# Altium footprint library MyLib.PcbLib: 575 footprints (part 14 of 36)
Each footprint in its own frame and in the unit in brackets; x right, y up, seen from the top. Pads: shape width x height; smd on the part's side, far side on the other; paste and mask are expansions set on the pad; w line width, h text height; cw(c..) or ccw(c..) is an arc to the next point about the centre after c.
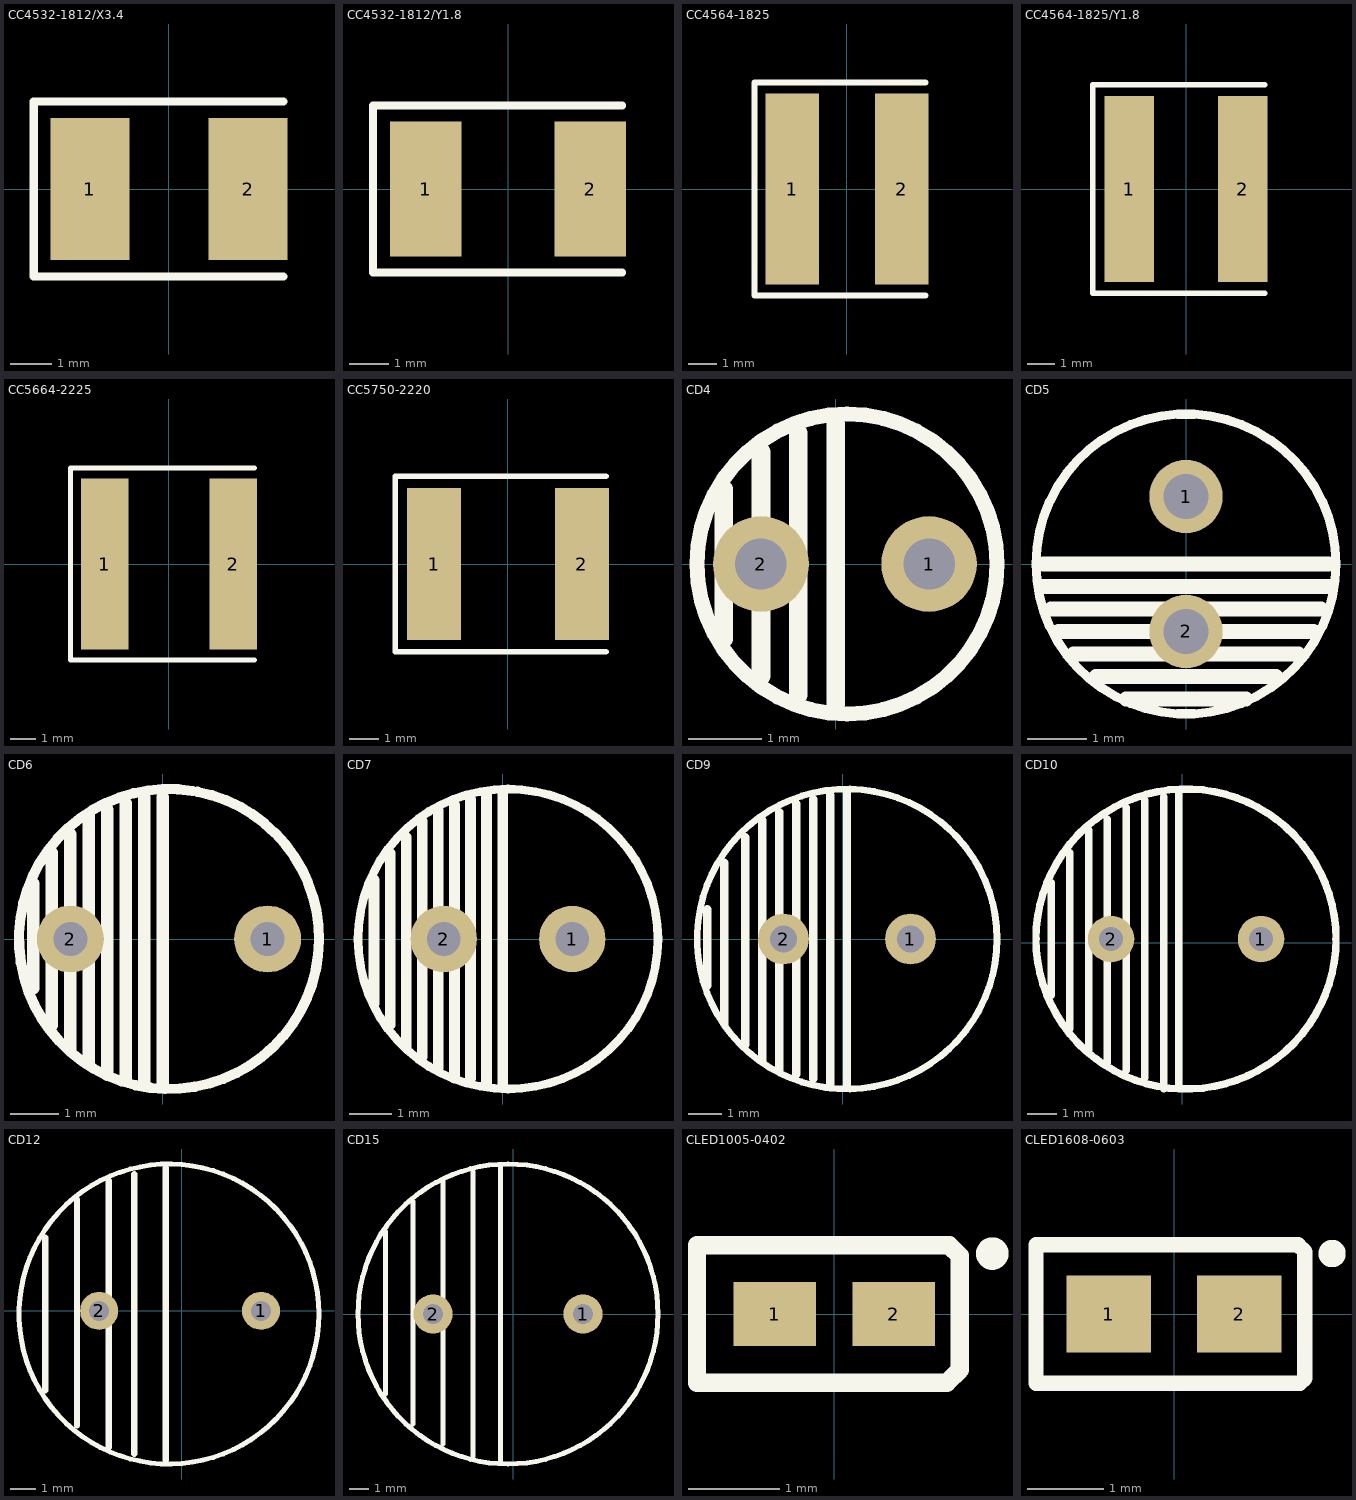
[diagram p13: the footprints below, top view; thin cyan lines are the x and y axes]

## CC4532-1812/X3.4 [mm]
pads (2):
  rect 1.9x3.4 smd: 1(-1.9,0) 2(1.9,0)
Top Overlay:
  lines w0.2: 2.75,-2.1 -3.25,-2.1 -3.25,2.1 2.75,2.1

## CC4532-1812/Y1.8 [mm]
pads (2):
  rect 1.8x3.4 smd: 1(-2.075,0) 2(2.075,0)
Top Overlay:
  lines w0.2: 2.875,-2.1 -3.4,-2.1 -3.4,2.1 2.875,2.1

## CC4564-1825 [mm]
pads (2):
  rect 1.9x6.8 smd: 1(-1.95,0) 2(1.95,0)
Top Overlay:
  lines w0.2: 2.8,-3.8 -3.3,-3.8 -3.3,3.8 2.8,3.8

## CC4564-1825/Y1.8 [mm]
pads (2):
  rect 1.8x6.8 smd: 1(-2.075,0) 2(2.075,0)
Top Overlay:
  lines w0.2: 2.875,-3.8 -3.4,-3.8 -3.4,3.8 2.875,3.8

## CC5664-2225 [mm]
pads (2):
  rect 1.9x6.8 smd: 1(-2.55,0) 2(2.55,0)
Top Overlay:
  lines w0.2: 3.4,-3.8 -3.9,-3.8 -3.9,3.8 3.4,3.8

## CC5750-2220 [mm]
pads (2):
  rect 1.85x5.2 smd: 1(-2.525,0) 2(2.525,0)
Top Overlay:
  lines w0.2: 3.35,-3 -3.85,-3 -3.85,3 3.35,3

## CD4 [mm]
pads (2):
  round 1.3 hole 0.7: 1(1.27,0) 2(-1.016,0)
Top Overlay:
  circle w0.203: c0.154,0 r2.04
  lines w0.254: -1.524,-1.016 -1.524,1.016 ; -1.016,-1.524 -1.016,1.524 ; -0.508,-1.778 -0.508,1.778 ; 0,-1.905 0,1.905
3D body "CAP PR1.5x4x7mm.STEP": height 7.06, standoff -16.94, extent -1.873,-2.032 2.127,1.968

## CD5 [mm]
pads (2):
  round 1.24 hole 0.762: 1(0,1.143) 2(0,-1.143)
Top Overlay:
  circle w0.154: c0,0 r2.54
  lines w0.254: -2.413,-0.381 2.413,-0.381 ; -2.413,0 2.413,0 ; -2.286,-0.762 2.286,-0.762 ; -2.159,-1.143 2.159,-1.143 ; -1.905,-1.524 1.905,-1.524 ; -1.524,-1.905 1.524,-1.905 ; -1.016,-2.286 1.016,-2.286
3D body "CAP PR2.0x5x11mm.STEP": height 11.53, standoff -3.27, extent -2.511,-2.652 2.54,2.398

## CD6 [mm]
pads (2):
  round 1.38 hole 0.7: 1(2.159,0) 2(-1.905,0)
Top Overlay:
  lines w0.21: 0.61,3.052 ccw(c0.127,0) 0.717,3.033
  lines w0.254: -2.667,-1.016 -2.667,1.143 ; -2.286,-1.778 -2.286,1.778 ; -1.905,-2.286 -1.905,2.159 ; -1.524,-2.54 -1.524,2.54 ; -1.143,-2.794 -1.143,2.667 ; -0.762,-2.921 -0.762,2.794 ; -0.381,-2.921 -0.381,2.921 ; 0,-3.048 0,2.921
3D body "CAP PR2.5x6.3x11mm.STEP": height 11.53, standoff -3.01, extent -2.921,-3.175 3.43,3.176

## CD7 [mil]
pads (2):
  round 62 hole 31.5: 1(65,0) 2(-55,0)
Top Overlay:
  circle w8: c5,0 r140
  lines w10: -120,-60 -120,55 ; -105,-80 -105,80 ; -90,-100 -90,95 ; -75,-110 -75,110 ; -60,-120 -60,120 ; -45,-130 -45,125 ; -30,-130 -30,130 ; -15,-135 -15,135 ; 0,-135 0,135
3D body: height 477.17, standoff -393.56, extent -159.85,-159.85 159.84,159.84

## CD9 [mil]
pads (2):
  round 60 hole 31.5: 1(80,0) 2(-70,0)
Top Overlay:
  circle w7.87: c5,0 r177.17
  lines w10: -160,-55 -160,35 ; -140,-100 -140,90 ; -115,-125 -115,120 ; -95,-145 -95,140 ; -75,-155 -75,150 ; -55,-160 -55,160 ; -35,-165 -35,165 ; -15,-175 -15,170 ; 5,-175 5,175
3D body "CAP PR3.5x8x11.5mm.STEP": height 473.44, standoff -136.91, extent -153.47,-158.47 163.49,158.49

## CD10 [mil]
pads (2):
  round 62 hole 31.5: 1(105,5) 2(-95,5)
Top Overlay:
  circle w10: c5,5 r200
  lines w10: -175,-70 -175,80 ; -150,-115 -150,120 ; -125,-145 -125,150 ; -100,-160 -100,165 ; -75,-170 -75,180 ; -50,-180 -50,190 ; -25,-195 -25,195 ; -5,-195 -5,200
3D body "CAP PR5.0x10x12.5mm.STEP": height 512.81, standoff -136.91, extent -192.85,-192.85 202.85,202.85

## CD12 [mil]
pads (2):
  round 60 hole 31.5: 1(125,0) 2(-130,0)
Top Overlay:
  circle w7.87: c-20,-5 r236.22
  lines w10: -215,-125 -215,115 ; -165,-180 -165,175 ; -115,-215 -115,205 ; -75,-225 -75,215 ; -25,-235 -25,225

## CD15 [mm]
pads (2):
  round 2 hole 1: 1(3.556,0) 2(-4.064,0)
Top Overlay:
  circle w0.254: c-0.254,0 r7.62
  lines w0.254: -6.477,-4.064 -6.477,4.191 ; -5.08,-5.588 -5.08,5.715 ; -3.556,-6.604 -3.556,6.731 ; -2.032,-7.239 -2.032,7.239 ; -0.635,-7.493 -0.635,7.493

## CLED1005-0402 [mm]
pads (2):
  rect 0.9x0.7 smd: 1(-0.65,0) 2(0.65,0)
Top Overlay:
  circle w0.254: c1.727,0.66 r0.051
  lines w0.2: -1.5,-0.75 1,-0.75 1.231,-0.75 1.372,-0.61 1.372,0.635 1.257,0.75 1,0.75 -1.5,0.75 -1.5,-0.75
3D body: height 0.4, standoff 0, extent -0.5,-0.25 0.5,0.25

## CLED1608-0603 [mm]
pads (2):
  rect 1.1x1 smd: 1(-0.85,0) 2(0.85,0)
Top Overlay:
  circle w0.254: c2.057,0.787 r0.051
  lines w0.2: -1.8,-0.9 -1.8,0.9 1.3,0.9 1.615,0.9 1.702,0.813 1.702,-0.838 1.64,-0.9 1.3,-0.9 -1.8,-0.9
3D body "LED0603.STEP": height 0.6, standoff 0, extent -0.8,-0.4 0.8,0.4